# Altium footprint library Footprints_SOC.PcbLib: 201 footprints (part 13 of 13)
Each footprint in its own frame and in the unit in brackets; x right, y up, seen from the top. Pads: shape width x height; smd on the part's side, far side on the other; paste and mask are expansions set on the pad; w line width, h text height; cw(c..) or ccw(c..) is an arc to the next point about the centre after c.
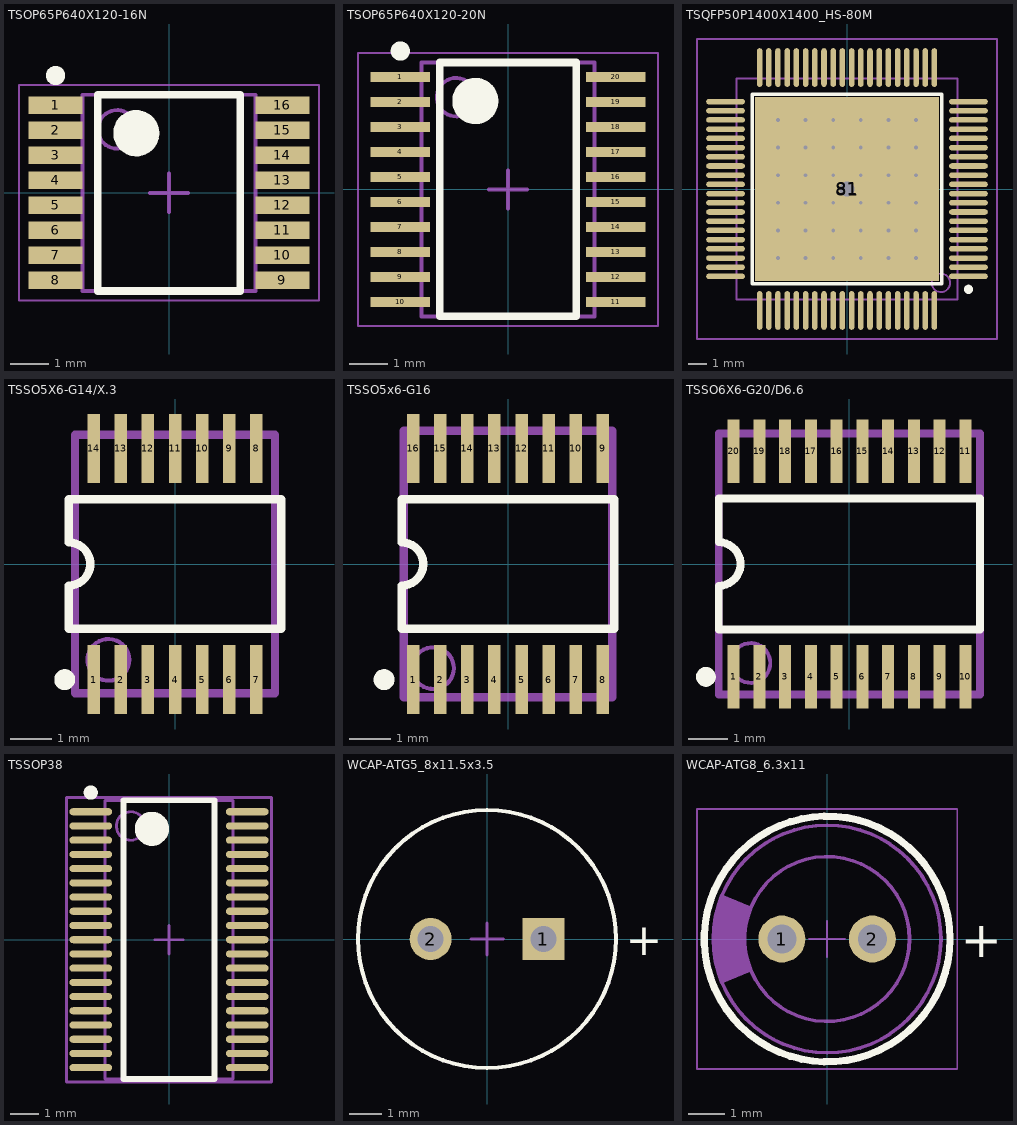
[diagram p12: the footprints below, top view; thin cyan lines are the x and y axes]

## TSOP65P640X120-16N [mm] "TSOP, 16-Leads, Body 5,00x4,40mm, Pitch 0,65mm, IPC Medium Density"
height 1.2
pads (16):
  rect 1.4x0.45 smd: 1(-2.95,2.275) 2(-2.95,1.625) 3(-2.95,0.975) 4(-2.95,0.325) 5(-2.95,-0.325) 6(-2.95,-0.975) 7(-2.95,-1.625) 8(-2.95,-2.275) 9(2.95,-2.275) 10(2.95,-1.625) 11(2.95,-0.975) 12(2.95,-0.325) 13(2.95,0.325) 14(2.95,0.975) 15(2.95,1.625) 16(2.95,2.275)
Top Overlay:
  circle w0.6: c-0.85,1.55 r0.3
  circle w0.25: c-2.95,3.05 r0.125
  lines w0.2: -1.85,-2.55 1.85,-2.55 1.85,2.55 -1.85,2.55 -1.85,-2.55
Top Assembly:
  circle w0.1: c-1.35,1.65 r0.5
  lines w0.1: -2.25,-2.55 -2.25,2.55 2.25,2.55 2.25,-2.55 -2.25,-2.55
  text ".Designator" at -0.762,2.032 h1.52
Mechanical 15:
  lines w0.05: -3.9,-2.8 3.9,-2.8 3.9,2.8 -3.9,2.8 -3.9,-2.8
  lines w0.1: -0.5,0 0.5,0 ; 0,-0.5 0,0.5
3D body "User Library-TSSOP-16-1.STEP": height 1.1, standoff 0, extent -3.2,-2.5 3.2,2.5

## TSOP65P640X120-20N [mm] "TSOP, 20-Leads, Body 6,50x4,40mm, Pitch 0,65mm, IPC Medium Density"
height 1.2
pads (20):
  rect 1.55x0.25 smd: 1(-2.8,2.925) 2(-2.8,2.275) 3(-2.8,1.625) 4(-2.8,0.975) 5(-2.8,0.325) 6(-2.8,-0.325) 7(-2.8,-0.975) 8(-2.8,-1.625) 9(-2.8,-2.275) 10(-2.8,-2.925) 11(2.8,-2.925) 12(2.8,-2.275) 13(2.8,-1.625) 14(2.8,-0.975) 15(2.8,-0.325) 16(2.8,0.325) 17(2.8,0.975) 18(2.8,1.625) 19(2.8,2.275) 20(2.8,2.925)
Top Overlay:
  circle w0.6: c-0.85,2.3 r0.3
  circle w0.25: c-2.8,3.6 r0.125
  lines w0.2: -1.778,-3.3 1.778,-3.3 1.778,3.3 -1.778,3.3 -1.778,-3.3
Top Assembly:
  circle w0.1: c-1.35,2.4 r0.5
  lines w0.1: -2.25,-3.3 2.25,-3.3 2.25,3.3 -2.25,3.3 -2.25,-3.3
  text ".Designator" at 0,2.794 h1.52
Mechanical 15:
  lines w0.05: -3.9,-3.55 3.9,-3.55 3.9,3.55 -3.9,3.55 -3.9,-3.55
  lines w0.1: -0.5,0 0.5,0 ; 0,-0.5 0,0.5
3D body "User Library-tssop-20-1.STEP": height 1.2, standoff 0, extent -3.3,-3.3 3.3,3.3

## TSQFP50P1400X1400_HS-80M [mm] "80-Pin Plastic Quad Flat Pack PowerPAD"
height 1.2
pads (82):
  oval 2.1x0.3 smd: 1(6.6,-4.75) 2(6.6,-4.25) 3(6.6,-3.75) 4(6.6,-3.25) 5(6.6,-2.75) 6(6.6,-2.25) 7(6.6,-1.75) 8(6.6,-1.25) 9(6.6,-0.75) 10(6.6,-0.25) 11(6.6,0.25) 12(6.6,0.75) 13(6.6,1.25) 14(6.6,1.75) 15(6.6,2.25) 16(6.6,2.75) 17(6.6,3.25) 18(6.6,3.75) 19(6.6,4.25) 20(6.6,4.75) 41(-6.6,4.75) 42(-6.6,4.25) 43(-6.6,3.75) 44(-6.6,3.25) 45(-6.6,2.75) 46(-6.6,2.25) 47(-6.6,1.75) 48(-6.6,1.25) 49(-6.6,0.75) 50(-6.6,0.25) 51(-6.6,-0.25) 52(-6.6,-0.75) 53(-6.6,-1.25) 54(-6.6,-1.75) 55(-6.6,-2.25) 56(-6.6,-2.75) 57(-6.6,-3.25) 58(-6.6,-3.75) 59(-6.6,-4.25) 60(-6.6,-4.75)
  oval 0.3x2.1 smd: 21(4.75,6.6) 22(4.25,6.6) 23(3.75,6.6) 24(3.25,6.6) 25(2.75,6.6) 26(2.25,6.6) 27(1.75,6.6) 28(1.25,6.6) 29(0.75,6.6) 30(0.25,6.6) 31(-0.25,6.6) 32(-0.75,6.6) 33(-1.25,6.6) 34(-1.75,6.6) 35(-2.25,6.6) 36(-2.75,6.6) 37(-3.25,6.6) 38(-3.75,6.6) 39(-4.25,6.6) 40(-4.75,6.6) 61(-4.75,-6.6) 62(-4.25,-6.6) 63(-3.75,-6.6) 64(-3.25,-6.6) 65(-2.75,-6.6) 66(-2.25,-6.6) 67(-1.75,-6.6) 68(-1.25,-6.6) 69(-0.75,-6.6) 70(-0.25,-6.6) 71(0.25,-6.6) 72(0.75,-6.6) 73(1.25,-6.6) 74(1.75,-6.6) 75(2.25,-6.6) 76(2.75,-6.6) 77(3.25,-6.6) 78(3.75,-6.6) 79(4.25,-6.6) 80(4.75,-6.6)
  rect 10x10 smd mask-1.9: 81(0,0)
  round 1.5 hole 0.8: 81(0,0)
via -0.75,0.75 diameter 0.45 hole 0.2
via -3.75,-0.75 diameter 0.45 hole 0.2
via -2.25,-0.75 diameter 0.45 hole 0.2
via -0.75,-0.75 diameter 0.45 hole 0.2
via 3.75,-0.75 diameter 0.45 hole 0.2
via 2.25,-0.75 diameter 0.45 hole 0.2
via 0.75,-0.75 diameter 0.45 hole 0.2
via -3.75,-2.25 diameter 0.45 hole 0.2
via -2.25,-2.25 diameter 0.45 hole 0.2
via -0.75,-2.25 diameter 0.45 hole 0.2
via 3.75,-2.25 diameter 0.45 hole 0.2
via 2.25,-2.25 diameter 0.45 hole 0.2
via 0.75,-2.25 diameter 0.45 hole 0.2
via -3.75,-3.75 diameter 0.45 hole 0.2
via -2.25,-3.75 diameter 0.45 hole 0.2
via -0.75,-3.75 diameter 0.45 hole 0.2
via 3.75,-3.75 diameter 0.45 hole 0.2
via 2.25,-3.75 diameter 0.45 hole 0.2
via 0.75,-3.75 diameter 0.45 hole 0.2
via -3.75,0.75 diameter 0.45 hole 0.2
via -2.25,0.75 diameter 0.45 hole 0.2
via 3.75,0.75 diameter 0.45 hole 0.2
via 2.25,0.75 diameter 0.45 hole 0.2
via 0.75,0.75 diameter 0.45 hole 0.2
via -3.75,2.25 diameter 0.45 hole 0.2
via -2.25,2.25 diameter 0.45 hole 0.2
via -0.75,2.25 diameter 0.45 hole 0.2
via 3.75,2.25 diameter 0.45 hole 0.2
via 2.25,2.25 diameter 0.45 hole 0.2
via 0.75,2.25 diameter 0.45 hole 0.2
via -3.75,3.75 diameter 0.45 hole 0.2
via -2.25,3.75 diameter 0.45 hole 0.2
via -0.75,3.75 diameter 0.45 hole 0.2
via 3.75,3.75 diameter 0.45 hole 0.2
via 2.25,3.75 diameter 0.45 hole 0.2
via 0.75,3.75 diameter 0.45 hole 0.2
Top Overlay:
  circle w0.25: c6.6,-5.45 r0.125
  lines w0.2: -5.15,-5.15 5.15,-5.15 5.15,5.15 -5.15,5.15 -5.15,-5.15
Top Assembly:
  circle w0.1: c5.1,-5.1 r0.5
  lines w0.1: -6,-6 -6,6 6,6 6,-6 -6,-6
  text ".Designator" at -4.124,-0.557 h2
Mechanical 15:
  lines w0.1: -0.5,0 0.5,0 ; 0,-0.5 0,0.5 ; -8.15,-8.15 8.15,-8.15 8.15,8.15 -8.15,8.15 -8.15,-8.15
3D body: height 1.2, standoff 0, extent -6,-6 6,6

## TSSO5X6-G14/X.3 [mm] "Shrink Small Outline, TSSOP; 14 Leads; Body Width 4.4 mm; Pitch 0.65 mm"
height 1.2
pads (14):
  rect 0.3x1.65 smd: 1(-1.95,-2.775) 2(-1.3,-2.775) 3(-0.65,-2.775) 4(0,-2.775) 5(0.65,-2.775) 6(1.3,-2.775) 7(1.95,-2.775) 8(1.95,2.775) 9(1.3,2.775) 10(0.65,2.775) 11(0,2.775) 12(-0.65,2.775) 13(-1.3,2.775) 14(-1.95,2.775)
Top Overlay:
  circle w0.25: c-2.65,-2.775 r0.125
  lines w0.2: -2.55,-1.55 -2.55,-0.517 ccw(c-2.55,0) -2.55,0.517 -2.55,1.55 2.55,1.55 2.55,-1.55 -2.55,-1.55
Top Assembly:
  circle w0.1: c-1.6,-2.3 r0.5
  lines w0.2: -2.4,-3.1 -2.4,3.1 2.4,3.1 2.4,-3.1 -2.4,-3.1
  text ".Designator" at -1.924,-0.291 h1
3D body "tssop_14.step": height 1.16, standoff -0.06, extent -2.5,-3.215 2.5,3.187

## TSSO5x6-G16 [mm] "Shrink Small Outline; 16 Leads; Body Width 4.4 mm; Pitch 0.65 mm"
height 1.1
pads (16):
  rect 0.3x1.65 smd: 1(-2.275,-2.775) 2(-1.625,-2.775) 3(-0.975,-2.775) 4(-0.325,-2.775) 5(0.325,-2.775) 6(0.975,-2.775) 7(1.625,-2.775) 8(2.275,-2.775) 9(2.275,2.775) 10(1.625,2.775) 11(0.975,2.775) 12(0.325,2.775) 13(-0.325,2.775) 14(-0.975,2.775) 15(-1.625,2.775) 16(-2.275,2.775)
Top Overlay:
  circle w0.25: c-2.975,-2.775 r0.125
  lines w0.2: -2.55,-1.55 2.55,-1.55 2.55,1.55 -2.55,1.55 -2.55,0.517 cw(c-2.55,0) -2.55,-0.517 -2.55,-1.55
Top Assembly:
  circle w0.1: c-1.8,-2.5 r0.5
  lines w0.2: -2.5,-3.2 -2.5,3.2 2.5,3.2 2.5,-3.2 -2.5,-3.2
  text ".Designator" at -1.924,-0.291 h1
3D body "TSSOP16.stp": height 1.11, standoff 0.01, extent -2.554,-3.217 2.548,3.214

## TSSO6X6-G20/D6.6 [mm] "Shrink Small Outline; 20 Leads; Body Width 4.4 mm; Pitch 0.65 mm"
height 1.1
pads (20):
  rect 0.3x1.6 smd: 1(-2.925,-2.85) 2(-2.275,-2.85) 3(-1.625,-2.85) 4(-0.975,-2.85) 5(-0.325,-2.85) 6(0.325,-2.85) 7(0.975,-2.85) 8(1.625,-2.85) 9(2.275,-2.85) 10(2.925,-2.85) 11(2.925,2.85) 12(2.275,2.85) 13(1.625,2.85) 14(0.975,2.85) 15(0.325,2.85) 16(-0.325,2.85) 17(-0.975,2.85) 18(-1.625,2.85) 19(-2.275,2.85) 20(-2.925,2.85)
Top Overlay:
  circle w0.25: c-3.625,-2.85 r0.125
  lines w0.2: -3.3,-1.65 3.3,-1.65 3.3,1.65 -3.3,1.65 -3.3,0.55 cw(c-3.3,0) -3.3,-0.55 -3.3,-1.65
Top Assembly:
  circle w0.1: c-2.5,-2.5 r0.5
  lines w0.2: -3.3,-3.3 3.3,-3.3 3.3,3.3 -3.3,3.3 -3.3,-3.3
  text ".Designator" at -2.624,-0.191 h1
3D body "User Library-tssop-20-1.STEP": height 1.2, standoff 0, extent -3.303,-3.29 3.296,3.31

## TSSOP38 [mm]
pads (38):
  oval 1.5x0.25 smd: 1(-2.75,4.5) 2(-2.75,4) 3(-2.75,3.5) 4(-2.75,3) 5(-2.75,2.5) 6(-2.75,2) 7(-2.75,1.5) 8(-2.75,1) 9(-2.75,0.5) 10(-2.75,0) 11(-2.75,-0.5) 12(-2.75,-1) 13(-2.75,-1.5) 14(-2.75,-2) 15(-2.75,-2.5) 16(-2.75,-3) 17(-2.75,-3.5) 18(-2.75,-4) 19(-2.75,-4.5) 20(2.75,-4.5) 21(2.75,-4) 22(2.75,-3.5) 23(2.75,-3) 24(2.75,-2.5) 25(2.75,-2) 26(2.75,-1.5) 27(2.75,-1) 28(2.75,-0.5) 29(2.75,0) 30(2.75,0.5) 31(2.75,1) 32(2.75,1.5) 33(2.75,2) 34(2.75,2.5) 35(2.75,3) 36(2.75,3.5) 37(2.75,4) 38(2.75,4.5)
Top Overlay:
  circle w0.6: c-0.6,3.9 r0.3
  circle w0.25: c-2.75,5.175 r0.125
  lines w0.2: -1.6,-4.9 1.6,-4.9 1.6,4.9 -1.6,4.9 -1.6,-4.9
Top Assembly:
  circle w0.1: c-1.35,4 r0.5
  lines w0.1: -2.25,-4.9 2.25,-4.9 2.25,4.9 -2.25,4.9 -2.25,-4.9
  text ".Designator" at 0.424,-4.424 h1.5
Mechanical 15:
  lines w0.1: -0.5,0 0.5,0 ; 0,-0.5 0,0.5 ; -3.6,-5 3.6,-5 3.6,5 -3.6,5 -3.6,-5
3D body: height 1.2, standoff 0, extent -2.25,-4.9 2.25,4.9

## WCAP-ATG5_8x11.5x3.5 [mm] "Aluminum Electrolytic Capacitors, 8x11.5mm"
height 11.5
pads (2):
  rect 1.3x1.3 hole 0.8: 1(1.75,0)
  round 1.3 hole 0.8: 2(-1.75,0)
Top Overlay:
  circle w0.127: c0,0 r4
  text "+" at 4.3,-0.5 h1
Top Assembly:
  circle w0.1: c0,0 r4
  text ".Designator" at -1.016,4.191 h1.02
Mechanical 15:
  lines w0.1: -0.5,0 0.5,0 ; 0,-0.5 0,0.5
3D body "8x11.5x3.5x0.5.stp": height 11.81, standoff -19.91, extent -3.99,-4 4,3.999

## WCAP-ATG8_6.3x11 [mm] "Aluminum Electrolytic Capacitors, 6.3x11mm"
height 12.5
pads (2):
  round 1.3 hole 0.8: 1(-1.25,0) 2(1.25,0)
Top Overlay:
  circle w0.2: c0,0 r3.4
  text "+" at 3.7,-0.5 h1
Top Assembly:
  circle w0.1: c0,0 r2.28
  circle w0.1: c0,0 r3.15
  region: -2.902,-1.225 -2.963,-1.08 -3.056,-0.779 -3.119,-0.471 -3.15,-0.157 -3.15,0.157 -3.119,0.471 -3.056,0.779 -2.963,1.08 -2.902,1.225 -2.1,0.887 -2.101,0.885 -2.179,0.671 -2.269,0.227 -2.269,-0.227 -2.179,-0.671 -2.101,-0.885 -2.1,-0.887
  text ".Designator" at 3.908,-0.384 h1.52
Mechanical 15:
  lines w0.05: -0.5,0 0.5,0 ; 0,-0.5 0,0.5 ; -3.6,-3.6 -3.6,3.6 3.6,3.6 3.6,-3.6 -3.6,-3.6
3D body "6.3x11x2.5x0.5.stp": height 11.31, standoff -19.91, extent -3.14,-3.15 3.15,3.148